# Altium footprint library My_Intlib.PcbLib: 224 footprints (part 13 of 14)
Each footprint in its own frame and in the unit in brackets; x right, y up, seen from the top. Pads: shape width x height; smd on the part's side, far side on the other; paste and mask are expansions set on the pad; w line width, h text height; cw(c..) or ccw(c..) is an arc to the next point about the centre after c.
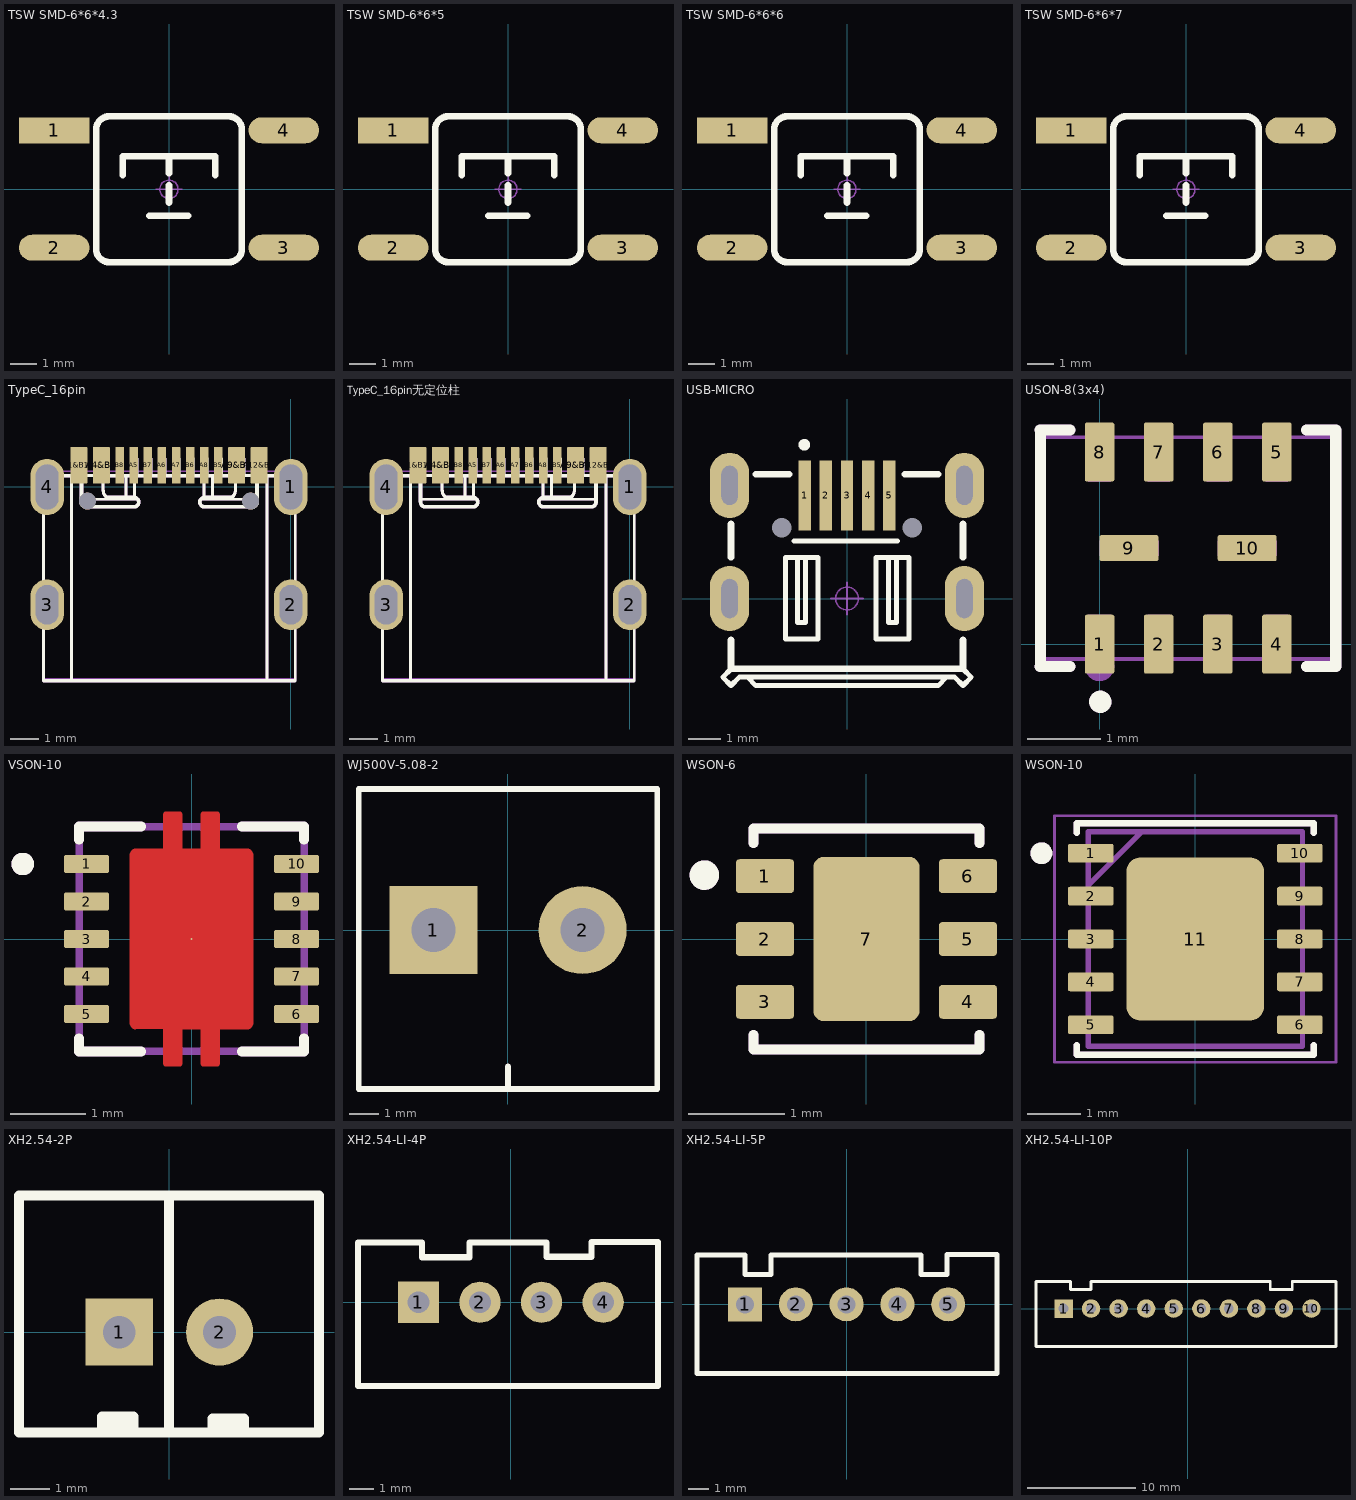
[diagram p12: the footprints below, top view; thin cyan lines are the x and y axes]

## TSW SMD-6*6*4.3 [mm] "6*6*4.3mm"
pads (4):
  rect 2.7x1 smd: 1(-4.4,2.261)
  oval 2.7x1 smd: 2(-4.4,-2.239) 3(4.4,-2.239) 4(4.4,2.261)
Top Overlay:
  lines w0.254: -1.778,0.533 -1.778,1.27 1.778,1.27 1.778,0.533 ; -0.762,-1.016 0.737,-1.016 ; 0,-0.508 0,0.152 ; 0,0.61 0,1.27 ; -2.794,-2.286 ccw(c-2.286,-2.286) -2.286,-2.794 2.286,-2.794 ccw(c2.286,-2.286) 2.794,-2.286 2.794,2.286 ccw(c2.286,2.286) 2.286,2.794 -2.286,2.794 ccw(c-2.286,2.286) -2.794,2.286 -2.794,-2.286
Mechanical 15:
  circle w0.05: c0,0 r0.35
  lines w0.05: -0.5,0 0.5,0 ; 0,-0.5 0,0.5
3D body "TSW SMD-6x6x4.3.STEP": height 4.25, standoff 0.05, extent -4.5,-3 4.5,3

## TSW SMD-6*6*5 [mm] "6*6*5mm"
pads (4):
  rect 2.7x1 smd: 1(-4.4,2.261)
  oval 2.7x1 smd: 2(-4.4,-2.239) 3(4.4,-2.239) 4(4.4,2.261)
Top Overlay:
  lines w0.254: -1.778,0.533 -1.778,1.27 1.778,1.27 1.778,0.533 ; -0.762,-1.016 0.737,-1.016 ; 0,-0.508 0,0.152 ; 0,0.61 0,1.27 ; -2.794,-2.286 ccw(c-2.286,-2.286) -2.286,-2.794 2.286,-2.794 ccw(c2.286,-2.286) 2.794,-2.286 2.794,2.286 ccw(c2.286,2.286) 2.286,2.794 -2.286,2.794 ccw(c-2.286,2.286) -2.794,2.286 -2.794,-2.286
Mechanical 15:
  circle w0.05: c0,0 r0.35
  lines w0.05: -0.5,0 0.5,0 ; 0,-0.5 0,0.5
3D body "TSW SMD-6x6x5.STEP": height 4.95, standoff -0.03, extent -4.5,-3 4.5,3

## TSW SMD-6*6*6 [mm] "6*6*6mm"
pads (4):
  rect 2.7x1 smd: 1(-4.4,2.261)
  oval 2.7x1 smd: 2(-4.4,-2.239) 3(4.4,-2.239) 4(4.4,2.261)
Top Overlay:
  lines w0.254: -1.778,0.533 -1.778,1.27 1.778,1.27 1.778,0.533 ; -0.762,-1.016 0.737,-1.016 ; 0,-0.508 0,0.152 ; 0,0.61 0,1.27 ; -2.794,-2.286 ccw(c-2.286,-2.286) -2.286,-2.794 2.286,-2.794 ccw(c2.286,-2.286) 2.794,-2.286 2.794,2.286 ccw(c2.286,2.286) 2.286,2.794 -2.286,2.794 ccw(c-2.286,2.286) -2.794,2.286 -2.794,-2.286
Mechanical 15:
  circle w0.05: c0,0 r0.35
  lines w0.05: -0.5,0 0.5,0 ; 0,-0.5 0,0.5
3D body "TSW SMD-6x6x6.STEP": height 5.95, standoff -0.03, extent -4.5,-3 4.5,3

## TSW SMD-6*6*7 [mm] "6*6*7mm"
pads (4):
  rect 2.7x1 smd: 1(-4.4,2.261)
  oval 2.7x1 smd: 2(-4.4,-2.239) 3(4.4,-2.239) 4(4.4,2.261)
Top Overlay:
  lines w0.254: -1.778,0.533 -1.778,1.27 1.778,1.27 1.778,0.533 ; -0.762,-1.016 0.737,-1.016 ; 0,-0.508 0,0.152 ; 0,0.61 0,1.27 ; -2.794,-2.286 ccw(c-2.286,-2.286) -2.286,-2.794 2.286,-2.794 ccw(c2.286,-2.286) 2.794,-2.286 2.794,2.286 ccw(c2.286,2.286) 2.286,2.794 -2.286,2.794 ccw(c-2.286,2.286) -2.794,2.286 -2.794,-2.286
Mechanical 15:
  circle w0.05: c0,0 r0.35
  lines w0.05: -0.5,0 0.5,0 ; 0,-0.5 0,0.5
3D body "TSW SMD-6x6x7.STEP": height 6.95, standoff -0.03, extent -4.5,-3 4.5,3

## TypeC_16pin [mm] "TypeC_16pin接口"
pads (18):
  oval 1.2x2 hole 0.8 slot 1.6 at 90 deg mask+0.051: 1(0,0) 4(-8.65,0)
  oval 1.2x1.8 hole 0.8 slot 1.4 at 90 deg mask+0.051: 2(0,-4.18) 3(-8.65,-4.18)
  rrect10% 0.6x1.298 smd mask+0.051: A1&B12(-7.525,0.771) A4&B9(-6.725,0.771) A9&B4(-1.925,0.771) A12&B1(-1.125,0.771)
  rrect10% 0.3x1.3 smd mask+0.051: A5(-5.575,0.768) A6(-4.575,0.768) A7(-4.075,0.768) A8(-3.075,0.768) B5(-2.575,0.768) B6(-3.575,0.768) B7(-5.075,0.768) B8(-6.075,0.768)
  round 0.6 hole 0.6 unplated mask+0.102: ""(-7.225,-0.5) ""(-1.425,-0.5)
Top Overlay:
  drawing of 1046 lines, arcs and shapes, not listed
Top Value:
  text ".Comment" at 0.711,-2.44 h0.89
Top Assembly:
  text ".Designator" at 0.711,-1.646 h0.89
Mechanical 15:
  drawing of 1070 lines, arcs and shapes, not listed
3D body "TypeC_16pin.STEP": height 3.23, standoff -0.87, extent -8.788,-6.796 0.152,1.104

## TypeC_16pin无定位柱 [mm] "TypeC_16pin接口"
pads (16):
  oval 1.2x2 hole 0.8 slot 1.6 at 90 deg mask+0.051: 1(0,0) 4(-8.65,0)
  oval 1.2x1.8 hole 0.8 slot 1.4 at 90 deg mask+0.051: 2(0,-4.18) 3(-8.65,-4.18)
  rrect10% 0.6x1.298 smd mask+0.051: A1&B12(-7.525,0.771) A4&B9(-6.725,0.771) A9&B4(-1.925,0.771) A12&B1(-1.125,0.771)
  rrect10% 0.3x1.3 smd mask+0.051: A5(-5.575,0.768) A6(-4.575,0.768) A7(-4.075,0.768) A8(-3.075,0.768) B5(-2.575,0.768) B6(-3.575,0.768) B7(-5.075,0.768) B8(-6.075,0.768)
Top Overlay:
  drawing of 1046 lines, arcs and shapes, not listed
Top Value:
  text ".Comment" at 0.711,-2.44 h0.89
Top Assembly:
  text ".Designator" at 0.711,-1.646 h0.89
Mechanical 15:
  drawing of 1070 lines, arcs and shapes, not listed
3D body "TypeC_16pin.STEP": height 3.23, standoff -0.87, extent -8.788,-6.796 0.152,1.104

## USB-MICRO [mm] "micro型USB ，6.7*7.5*2.5mm"
pads (11):
  rect 0.381x2.15 smd: 1(-1.3,3.16) 2(-0.65,3.16) 3(0,3.16) 4(0.65,3.16) 5(1.3,3.16)
  oval 1.2x2 hole 0.5 slot 1.2 at 90 deg: ""(-3.6,0) ""(-3.6,3.47) ""(3.6,0) ""(3.6,3.47)
  round 0 hole 0.6 unplated: ""(-2,2.17) ""(2,2.17)
Top Overlay:
  circle w0.203: c-1.309,4.715 r0.076
  lines w0.152: -3.556,-2.159 -3.81,-2.413 -3.556,-2.667 -3.302,-2.413 -3.048,-2.413 ; -1.62,1.769 1.555,1.769 ; -1.524,1.257 -1.524,-0.728 -1.321,-0.728 -1.27,-0.728 -1.27,1.257 ; 1.27,1.257 1.27,-0.728 1.524,-0.728 1.524,1.257 ; 3.556,-2.159 3.81,-2.413 3.556,-2.667 3.302,-2.413 3.048,-2.413 ; -3.048,-2.413 -2.794,-2.673 2.794,-2.673 3.048,-2.413 ; -3.048,-2.413 3.048,-2.413 ; -1.885,-1.243 -0.885,-1.243 -0.885,1.257 -1.885,1.257 -1.885,-1.243 ; 0.896,-1.243 0.896,1.257 1.896,1.257 1.896,-1.243 0.896,-1.243
  lines w0.203: -3.556,-1.27 -3.556,-2.159 3.556,-2.159 3.556,-1.27 ; -3.556,1.27 -3.556,2.286 ; -2.794,3.81 -1.778,3.81 ; 1.778,3.81 2.794,3.81 ; 3.556,1.27 3.556,2.286
Top Value:
  text ".Comment" at -2.057,-4.522 h0.89
Top Assembly:
  text ".Designator" at -2.057,-3.729 h0.89
Mechanical 15:
  circle w0.05: c0,0 r0.35
  lines w0.05: -0.5,0 0.5,0 ; 0,-0.5 0,0.5
3D body "USB micro_D.STEP": height 2.79, standoff -0.95, extent -3.985,-2.75 3.985,3.95

## USON-8(3x4) [mm] "4*3*0.55mm(长宽高)"
pads (10):
  rrect15% 0.4x0.8 smd: 1(0,0) 2(0.8,0) 3(1.6,0) 4(2.4,0) 5(2.4,2.6) 6(1.6,2.6) 7(0.8,2.6) 8(0,2.6)
  rrect15% 0.8x0.35 smd: 9(0.398,1.3) 10(1.998,1.3)
Top Overlay:
  circle w0.2: c0.01,-0.78 r0.05
  lines w0.15: -0.802,-0.3 -0.402,-0.3 ; -0.802,2.9 -0.402,2.9 ; -0.801,-0.3 -0.801,2.9 ; 2.798,-0.3 3.197,-0.3 3.197,2.9 2.798,2.9
Top Value:
  text ".Comment" at 3.581,1.041 h0.89
Mechanical 6:
  circle w0.2: c0,-0.3 r0.1
Top Assembly:
  circle w0.2: c0.01,-0.78 r0.05
  lines w0.15: -0.802,-0.3 -0.402,-0.3 ; -0.802,2.9 -0.402,2.9 ; -0.801,-0.3 -0.801,2.9 ; 2.798,-0.3 3.197,-0.3 3.197,2.9 2.798,2.9
  text ".Designator" at 3.556,1.981 h0.89
Mechanical 15:
  region: -0.15,2.8 0.15,2.8 0.15,2.2 -0.15,2.2
  region: 0.65,2.8 0.95,2.8 0.95,2.2 0.65,2.2
  region: 1.45,2.8 1.75,2.8 1.75,2.2 1.45,2.2
  region: 2.25,2.8 2.55,2.8 2.55,2.2 2.25,2.2
  region: 2.25,0.4 2.55,0.4 2.55,-0.2 2.25,-0.2
  region: 1.45,0.4 1.75,0.4 1.75,-0.2 1.45,-0.2
  region: 0.65,0.4 0.95,0.4 0.95,-0.2 0.65,-0.2
  region: -0.15,0.4 0.15,0.4 0.15,-0.2 -0.15,-0.2
  region: 2.398,1.4 2.398,1.2 1.598,1.2 1.598,1.4
  region: 0.798,1.4 0.798,1.2 -0.002,1.2 -0.002,1.4
  region: -0.74,-0.2 -0.74,-0.175 -0.775,-0.14 -0.825,-0.14 -0.86,-0.175 -0.86,-0.2 -0.86,-0.225 -0.825,-0.26 -0.775,-0.26 -0.74,-0.225
  lines w0.051: -0.8,-0.2 -0.8,2.8 3.2,2.8 3.2,-0.2 -0.8,-0.2
3D body "W25Q32JVUUIQ.step": height 0.55, standoff 0, extent -0.816,-0.214 3.204,2.806

## VSON-10 [mm]
pads (11):
  rrect20% 0.6x0.24 smd: 1(-1.4,1) 2(-1.4,0.5) 3(-1.4,0) 4(-1.4,-0.5) 5(-1.4,-1) 6(1.4,-1) 7(1.4,-0.5) 8(1.4,0) 9(1.4,0.5) 10(1.4,1)
  round 0.025 smd: 11(0,0)
Top Layer:
  region: -0.746,-1.2 -0.375,-1.2 -0.375,-1.661 -0.375,-1.668 -0.369,-1.683 -0.358,-1.694 -0.343,-1.7 -0.336,-1.7 -0.164,-1.7 -0.157,-1.7 -0.142,-1.694 -0.131,-1.683 -0.125,-1.668 -0.125,-1.661 -0.125,-1.2 0.125,-1.2 0.125,-1.661 0.125,-1.668 0.131,-1.683 0.142,-1.694 0.157,-1.7 0.164,-1.7 0.336,-1.7 0.343,-1.7 0.358,-1.694 0.369,-1.683 0.375,-1.668 0.375,-1.661 0.375,-1.2 0.746,-1.2 0.762,-1.2 0.791,-1.188 0.813,-1.166 0.825,-1.137 0.825,-1.121 0.825,1.121 0.825,1.137 0.813,1.166 0.791,1.188 0.762,1.2 0.746,1.2 0.375,1.2 0.375,1.661 0.375,1.668 0.369,1.683 0.358,1.694 0.343,1.7 0.336,1.7 0.164,1.7 0.157,1.7 0.142,1.694 0.131,1.683 0.125,1.668 0.125,1.661 0.125,1.2 -0.125,1.2 -0.125,1.661 -0.125,1.668 -0.131,1.683 -0.142,1.694 -0.157,1.7 -0.164,1.7 -0.336,1.7 -0.343,1.7 -0.358,1.694 -0.369,1.683 -0.375,1.668 -0.375,1.661 -0.375,1.2 -0.746,1.2 -0.762,1.2 -0.791,1.188 -0.813,1.166 -0.825,1.137 -0.825,1.121 -0.825,-1.121 -0.825,-1.137 -0.813,-1.166 -0.791,-1.188 -0.762,-1.2
Top Overlay:
  lines w0.127: -1.5,-1.326 -1.5,-1.5 -0.667,-1.5 ; -1.5,1.326 -1.5,1.5 -0.667,1.5 ; 0.667,-1.5 1.5,-1.5 1.5,-1.326 ; 0.667,1.5 1.5,1.5 1.5,1.326
  lines w0.2: -2.3,1 ccw(c-2.25,1) -2.2,1 ; -2.3,1 cw(c-2.25,1) -2.2,1 ; -2.3,1 ccw(c-2.25,1) -2.2,1
Top Value:
  text ".Comment" at 1.93,0.025 h0.89
Top Assembly:
  lines w0.127: -1.5,-1.326 -1.5,-1.5 -0.667,-1.5 ; -1.5,1.326 -1.5,1.5 -0.667,1.5 ; 0.667,-1.5 1.5,-1.5 1.5,-1.326 ; 0.667,1.5 1.5,1.5 1.5,1.326
  lines w0.2: -2.3,1 ccw(c-2.25,1) -2.2,1 ; -2.3,1 cw(c-2.25,1) -2.2,1 ; -2.3,1 ccw(c-2.25,1) -2.2,1
  text ".Designator" at 1.905,0.965 h0.89
Mechanical 13:
  lines w0.1: -1.5,-1.5 1.5,-1.5 1.5,1.5 -1.5,1.5 -1.5,-1.5
3D body "UCC27282DRCR.stp": height 1.1, standoff 0, extent -1.5,-1.5 1.5,1.5

## WJ500V-5.08-2 [mm]
pads (2):
  rect 3x3 hole 1.5: 1(-2.54,0)
  round 3 hole 1.5: 2(2.54,0)
Top Overlay:
  lines w0.2: 0,-5.4 0,-4.638 ; -5.08,-5.41 5.08,-5.41 5.08,4.801 -5.08,4.801 -5.08,-5.41
3D body "38261.stp": height 15, standoff -3.5, extent -5.665,-4.8 5.065,4.7

## WSON-6 [mm]
pads (7):
  rrect20% 0.6x0.35 smd: 1(-1.05,0.65) 2(-1.05,0) 3(-1.05,-0.65) 4(1.05,-0.65) 5(1.05,0) 6(1.05,0.65)
  rrect20% 1.1x1.7 smd: 7(0,0)
Top Overlay:
  lines w0.102: -1.168,-0.991 -1.168,-1.143 0,-1.143 1.168,-1.143 1.168,-0.991 ; -1.168,0.991 -1.168,1.143 0,1.143 1.168,1.143 1.168,0.991
  lines w0.152: -1.602,0.679 ccw(c-1.676,0.66) -1.6,0.66
Top Assembly:
  lines w0.102: -1.168,-0.991 -1.168,-1.143 0,-1.143 1.168,-1.143 1.168,-0.991 ; -1.168,0.991 -1.168,1.143 0,1.143 1.168,1.143 1.168,0.991
  lines w0.152: -1.602,0.679 ccw(c-1.676,0.66) -1.6,0.66
3D body "TLV76701DRVR.stp": height 0.8, standoff 0, extent -1,-1 1,1

## WSON-10 [mm]
pads (11):
  rrect20% 0.85x0.35 smd: 1(-1.95,1.6) 2(-1.95,0.8) 3(-1.95,0) 4(-1.95,-0.8) 5(-1.95,-1.6) 6(1.95,-1.6) 7(1.95,-0.8) 8(1.95,0) 9(1.95,0.8) 10(1.95,1.6)
  rrect20% 2.565x3.048 smd: 11(0,0)
Top Overlay:
  circle w0.203: c-2.87,1.6 r0.102
  lines w0.127: -2.21,-1.981 -2.21,-2.159 0,-2.159 2.21,-2.159 2.21,-1.981 ; -2.21,1.981 -2.21,2.159 0,2.159 2.21,2.159 2.21,1.981
Top Value:
  text ".Comment" at 2.718,0.025 h0.89
Top Assembly:
  circle w0.203: c-2.87,1.6 r0.102
  lines w0.127: -2.21,-1.981 -2.21,-2.159 0,-2.159 2.21,-2.159 2.21,-1.981 ; -2.21,1.981 -2.21,2.159 0,2.159 2.21,2.159 2.21,1.981
  text ".Designator" at 2.692,0.965 h0.89
Mechanical 13:
  lines w0.1: -2,1 -1,2 ; -2,-2 2,-2 2,2 -2,2 -2,-2
Mechanical 15:
  lines w0.05: -2.625,-2.3 2.625,-2.3 2.625,2.3 -2.625,2.3 -2.625,-2.3
3D body "LMR14020SQDPRRQ1.stp": height 0.8, standoff 0, extent -2,-2 2,2

## XH2.54-2P [mm]
pads (2):
  rect 1.7x1.7 hole 0.83: 1(-1.27,0)
  round 1.7 hole 0.83: 2(1.27,0)
Top Overlay:
  lines w0.254: -1.71,-2.44 -1.71,-2.14 -0.91,-2.14 -0.91,-2.44 ; -1.66,-2.29 -0.91,-2.29 ; -0.01,-2.39 -0.01,3.46 ; 1.09,-2.49 1.09,-2.19 1.89,-2.19 1.89,-2.49 ; 1.09,-2.34 1.89,-2.34 ; -3.81,-2.54 3.79,-2.54 3.79,3.46 -3.81,3.46 -3.81,-2.54
3D body "XH2.54-2P.STEP": height 7, standoff -3.4, extent -3.717,-2.367 3.683,3.383

## XH2.54-LI-4P [mm] "接插件，4P"
pads (4):
  rect 1.7x1.7 hole 0.9: 1(-3.81,0)
  round 1.7 hole 0.9: 2(-1.27,0) 3(1.27,0) 4(3.81,0)
Top Overlay:
  lines w0.254: -6.299,-3.454 -6.299,2.464 -3.658,2.464 -3.658,1.854 -1.702,1.854 -1.702,2.464 1.473,2.464 1.473,1.88 3.327,1.88 3.327,2.489 6.071,2.489 6.071,-3.454 -6.299,-3.454
3D body "XH2.54-4P.STEP": height 7.03, standoff -2.47, extent -6.31,-3.3 6.31,2.4

## XH2.54-LI-5P [mm] "接插件，5P"
pads (5):
  rect 1.7x1.7 hole 0.9: 1(-5.08,0)
  round 1.7 hole 0.9: 2(-2.54,0) 3(0,0) 4(2.54,0) 5(5.08,0)
Top Overlay:
  lines w0.254: -3.78,2.438 -3.78,1.5 -5.08,1.5 -5.08,2.464 -7.48,2.464 -7.48,-3.454 7.52,-3.454 7.52,2.489 5.02,2.489 5.02,1.5 3.72,1.5 3.72,2.464 -3.78,2.464
3D body "XH2.54-5P.STEP": height 7.03, standoff -2.47, extent -7.58,-3.3 7.58,2.4

## XH2.54-LI-10P [mm] "接插件，10P"
pads (10):
  rect 1.7x1.7 hole 0.9: 1(-11.43,0)
  round 1.7 hole 0.9: 2(-8.89,0) 3(-6.35,0) 4(-3.81,0) 5(-1.27,0) 6(1.27,0) 7(3.81,0) 8(6.35,0) 9(8.89,0) 10(11.43,0)
Top Overlay:
  lines w0.254: -13.97,-3.5 13.691,-3.5 13.691,2.5 9.652,2.5 9.652,1.75 7.62,1.75 7.62,2.5 -8.89,2.5 -8.89,1.75 -10.795,1.75 -10.795,2.5 -13.97,2.5 -13.97,-3.5
3D body "XH2.54-10P.STEP": height 7.03, standoff -2.47, extent -13.93,-3.3 13.93,2.4